# Altium footprint library Package_DFN_QFN.PcbLib: 557 footprints (part 32 of 35)
Each footprint in its own frame and in the unit in brackets; x right, y up, seen from the top. Pads: shape width x height; smd on the part's side, far side on the other; paste and mask are expansions set on the pad; w line width, h text height; cw(c..) or ccw(c..) is an arc to the next point about the centre after c.
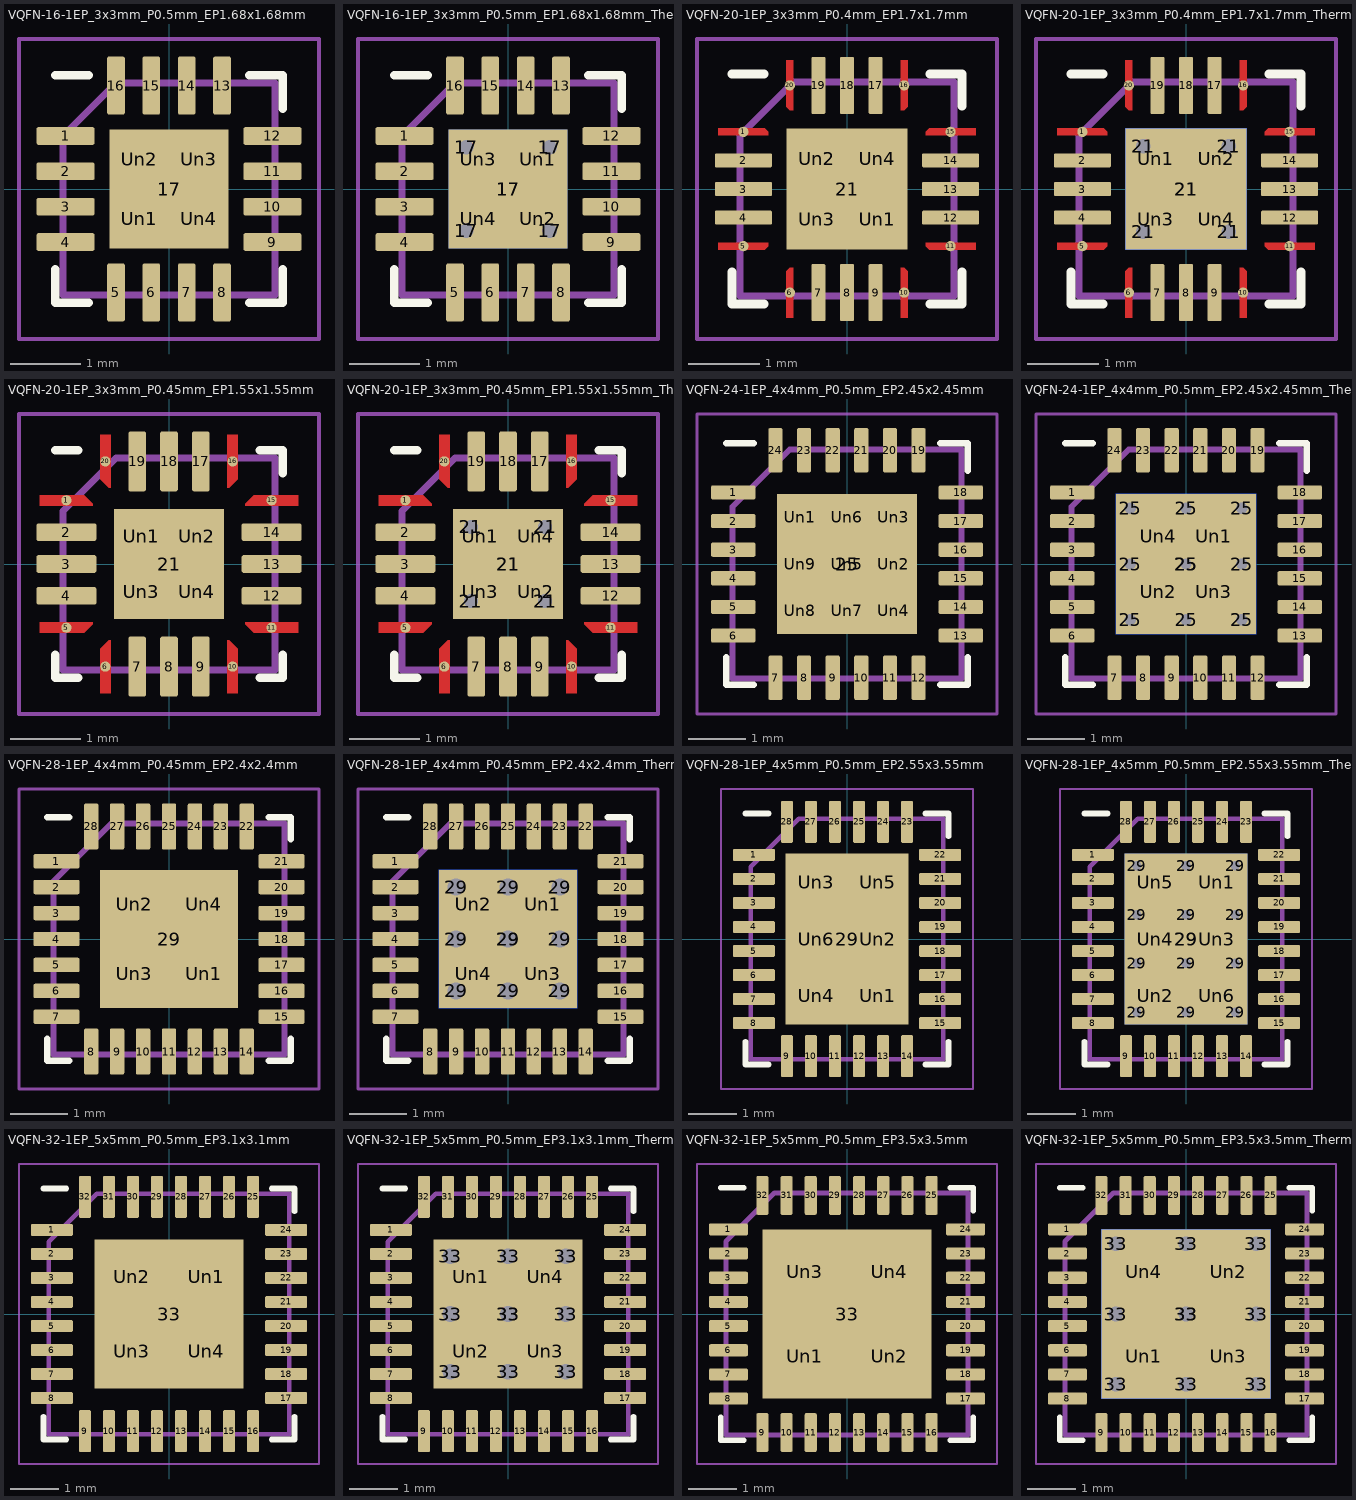
[diagram p31: the footprints below, top view; thin cyan lines are the x and y axes]

## VQFN-16-1EP_3x3mm_P0.5mm_EP1.68x1.68mm [mm]
pads (21):
  rrect25% 0.825x0.25 smd: 1(-1.462,0.75) 2(-1.462,0.25) 3(-1.462,-0.25) 4(-1.462,-0.75) 9(1.462,-0.75) 10(1.462,-0.25) 11(1.462,0.25) 12(1.462,0.75)
  rrect25% 0.25x0.825 smd: 5(-0.75,-1.462) 6(-0.25,-1.462) 7(0.25,-1.462) 8(0.75,-1.462) 13(0.75,1.462) 14(0.25,1.462) 15(-0.25,1.462) 16(-0.75,1.462)
  rect 1.68x1.68 smd: 17(0,0)
  rrect25% 0.68x0.68 on Top Paste: Un1(-0.42,-0.42) Un2(-0.42,0.42) Un3(0.42,0.42) Un4(0.42,-0.42)
F.SilkS:
  lines w0.12: -1.61,-1.135 -1.61,-1.61 -1.135,-1.61 ; -1.61,1.61 -1.135,1.61 ; 1.135,-1.61 1.61,-1.61 1.61,-1.135 ; 1.135,1.61 1.61,1.61 1.61,1.135
F.CrtYd:
  lines w0.05: -2.12,-2.12 2.12,-2.12 2.12,2.12 -2.12,2.12 -2.12,-2.12
F.Fab:
  lines w0.1: -1.5,-1.5 1.5,-1.5 1.5,1.5 -0.75,1.5 -1.5,0.75 -1.5,-1.5
  text "'.Designator'" at -3.033,-0.628 h0.75

## VQFN-16-1EP_3x3mm_P0.5mm_EP1.68x1.68mm_ThermalVias [mm]
pads (26):
  rrect25% 0.825x0.25 smd: 1(-1.462,0.75) 2(-1.462,0.25) 3(-1.462,-0.25) 4(-1.462,-0.75) 9(1.462,-0.75) 10(1.462,-0.25) 11(1.462,0.25) 12(1.462,0.75)
  rrect25% 0.25x0.825 smd: 5(-0.75,-1.462) 6(-0.25,-1.462) 7(0.25,-1.462) 8(0.75,-1.462) 13(0.75,1.462) 14(0.25,1.462) 15(-0.25,1.462) 16(-0.75,1.462)
  round 0.5 hole 0.2: 17(-0.59,-0.59) 17(-0.59,0.59) 17(0.59,-0.59) 17(0.59,0.59)
  rect 1.68x1.68 smd: 17(0,0)
  rect 1.68x1.68 smd far side: 17(0,0)
  rrect25% 0.73x0.73 on Top Paste: Un1(0.42,0.42) Un2(0.42,-0.42) Un3(-0.42,0.42) Un4(-0.42,-0.42)
F.SilkS:
  lines w0.12: -1.61,-1.135 -1.61,-1.61 -1.135,-1.61 ; -1.61,1.61 -1.135,1.61 ; 1.135,-1.61 1.61,-1.61 1.61,-1.135 ; 1.135,1.61 1.61,1.61 1.61,1.135
F.CrtYd:
  lines w0.05: -2.12,-2.12 -2.12,2.12 2.12,2.12 2.12,-2.12 -2.12,-2.12
F.Fab:
  lines w0.1: -1.5,-1.5 -1.5,0.75 -0.75,1.5 1.5,1.5 1.5,-1.5 -1.5,-1.5
  text "'.Designator'" at -3.033,-0.628 h0.75

## VQFN-20-1EP_3x3mm_P0.4mm_EP1.7x1.7mm [mm]
pads (25):
  round 0.143 smd: 1(-1.45,0.8) 5(-1.45,-0.8) 6(-0.8,-1.45) 10(0.8,-1.45) 11(1.45,-0.8) 15(1.45,0.8) 16(0.8,1.45) 20(-0.8,1.45)
  rrect25% 0.8x0.2 smd: 2(-1.45,0.4) 3(-1.45,0) 4(-1.45,-0.4) 12(1.45,-0.4) 13(1.45,0) 14(1.45,0.4)
  rrect25% 0.2x0.8 smd: 7(-0.4,-1.45) 8(0,-1.45) 9(0.4,-1.45) 17(0.4,1.45) 18(0,1.45) 19(-0.4,1.45)
  rect 1.7x1.7 smd: 21(0,0)
  rrect25% 0.69x0.69 on Top Paste: Un1(0.425,-0.425) Un2(-0.425,0.425) Un3(-0.425,-0.425) Un4(0.425,0.425)
F.Cu:
  region: -1.1,0.799 -1.1,0.75 -1.8,0.75 -1.8,0.85 -1.151,0.85
  region: -1.1,-0.799 -1.151,-0.85 -1.8,-0.85 -1.8,-0.75 -1.1,-0.75
  region: -0.75,-1.8 -0.85,-1.8 -0.85,-1.151 -0.799,-1.1 -0.75,-1.1
  region: 0.85,-1.151 0.85,-1.8 0.75,-1.8 0.75,-1.1 0.799,-1.1
  region: 1.8,-0.85 1.151,-0.85 1.1,-0.799 1.1,-0.75 1.8,-0.75
  region: 1.8,0.75 1.1,0.75 1.1,0.799 1.151,0.85 1.8,0.85
  region: 0.85,1.151 0.799,1.1 0.75,1.1 0.75,1.8 0.85,1.8
  region: -0.75,1.1 -0.799,1.1 -0.85,1.151 -0.85,1.8 -0.75,1.8
F.SilkS:
  lines w0.12: -1.61,-1.16 -1.61,-1.61 -1.16,-1.61 ; -1.61,1.61 -1.16,1.61 ; 1.16,-1.61 1.61,-1.61 1.61,-1.16 ; 1.16,1.61 1.61,1.61 1.61,1.16
F.Paste:
  region: -1.1,0.799 -1.1,0.75 -1.8,0.75 -1.8,0.85 -1.151,0.85
  region: -1.1,-0.799 -1.151,-0.85 -1.8,-0.85 -1.8,-0.75 -1.1,-0.75
  region: -0.75,-1.8 -0.85,-1.8 -0.85,-1.151 -0.799,-1.1 -0.75,-1.1
  region: 0.85,-1.151 0.85,-1.8 0.75,-1.8 0.75,-1.1 0.799,-1.1
  region: 1.8,-0.85 1.151,-0.85 1.1,-0.799 1.1,-0.75 1.8,-0.75
  region: 1.8,0.75 1.1,0.75 1.1,0.799 1.151,0.85 1.8,0.85
  region: 0.85,1.151 0.799,1.1 0.75,1.1 0.75,1.8 0.85,1.8
  region: -0.75,1.1 -0.799,1.1 -0.85,1.151 -0.85,1.8 -0.75,1.8
F.Mask:
  region: -1.1,0.799 -1.1,0.75 -1.8,0.75 -1.8,0.85 -1.151,0.85
  region: -1.1,-0.799 -1.151,-0.85 -1.8,-0.85 -1.8,-0.75 -1.1,-0.75
  region: -0.75,-1.8 -0.85,-1.8 -0.85,-1.151 -0.799,-1.1 -0.75,-1.1
  region: 0.85,-1.151 0.85,-1.8 0.75,-1.8 0.75,-1.1 0.799,-1.1
  region: 1.8,-0.85 1.151,-0.85 1.1,-0.799 1.1,-0.75 1.8,-0.75
  region: 1.8,0.75 1.1,0.75 1.1,0.799 1.151,0.85 1.8,0.85
  region: 0.85,1.151 0.799,1.1 0.75,1.1 0.75,1.8 0.85,1.8
  region: -0.75,1.1 -0.799,1.1 -0.85,1.151 -0.85,1.8 -0.75,1.8
F.CrtYd:
  lines w0.05: -2.1,-2.1 -2.1,2.1 2.1,2.1 2.1,-2.1 -2.1,-2.1
F.Fab:
  lines w0.1: -1.5,-1.5 -1.5,0.75 -0.75,1.5 1.5,1.5 1.5,-1.5 -1.5,-1.5
  text "'.Designator'" at -3.033,-0.628 h0.75

## VQFN-20-1EP_3x3mm_P0.4mm_EP1.7x1.7mm_ThermalVias [mm]
pads (30):
  round 0.143 smd: 1(-1.45,0.8) 5(-1.45,-0.8) 6(-0.8,-1.45) 10(0.8,-1.45) 11(1.45,-0.8) 15(1.45,0.8) 16(0.8,1.45) 20(-0.8,1.45)
  rrect25% 0.8x0.2 smd: 2(-1.45,0.4) 3(-1.45,0) 4(-1.45,-0.4) 12(1.45,-0.4) 13(1.45,0) 14(1.45,0.4)
  rrect25% 0.2x0.8 smd: 7(-0.4,-1.45) 8(0,-1.45) 9(0.4,-1.45) 17(0.4,1.45) 18(0,1.45) 19(-0.4,1.45)
  round 0.5 hole 0.2: 21(-0.6,-0.6) 21(-0.6,0.6) 21(0.6,-0.6) 21(0.6,0.6)
  rect 1.7x1.7 smd far side: 21(0,0)
  rect 1.7x1.7 smd: 21(0,0)
  rrect25% 0.74x0.74 on Top Paste: Un1(-0.425,0.425) Un2(0.425,0.425) Un3(-0.425,-0.425) Un4(0.425,-0.425)
F.Cu:
  region: -1.1,0.799 -1.1,0.75 -1.8,0.75 -1.8,0.85 -1.151,0.85
  region: -1.1,-0.799 -1.151,-0.85 -1.8,-0.85 -1.8,-0.75 -1.1,-0.75
  region: -0.75,-1.8 -0.85,-1.8 -0.85,-1.151 -0.799,-1.1 -0.75,-1.1
  region: 0.85,-1.151 0.85,-1.8 0.75,-1.8 0.75,-1.1 0.799,-1.1
  region: 1.8,-0.85 1.151,-0.85 1.1,-0.799 1.1,-0.75 1.8,-0.75
  region: 1.8,0.75 1.1,0.75 1.1,0.799 1.151,0.85 1.8,0.85
  region: 0.85,1.151 0.799,1.1 0.75,1.1 0.75,1.8 0.85,1.8
  region: -0.75,1.1 -0.799,1.1 -0.85,1.151 -0.85,1.8 -0.75,1.8
F.SilkS:
  lines w0.12: -1.61,-1.16 -1.61,-1.61 -1.16,-1.61 ; -1.61,1.61 -1.16,1.61 ; 1.16,-1.61 1.61,-1.61 1.61,-1.16 ; 1.16,1.61 1.61,1.61 1.61,1.16
F.Paste:
  region: -1.1,0.799 -1.1,0.75 -1.8,0.75 -1.8,0.85 -1.151,0.85
  region: -1.1,-0.799 -1.151,-0.85 -1.8,-0.85 -1.8,-0.75 -1.1,-0.75
  region: -0.75,-1.8 -0.85,-1.8 -0.85,-1.151 -0.799,-1.1 -0.75,-1.1
  region: 0.85,-1.151 0.85,-1.8 0.75,-1.8 0.75,-1.1 0.799,-1.1
  region: 1.8,-0.85 1.151,-0.85 1.1,-0.799 1.1,-0.75 1.8,-0.75
  region: 1.8,0.75 1.1,0.75 1.1,0.799 1.151,0.85 1.8,0.85
  region: 0.85,1.151 0.799,1.1 0.75,1.1 0.75,1.8 0.85,1.8
  region: -0.75,1.1 -0.799,1.1 -0.85,1.151 -0.85,1.8 -0.75,1.8
F.Mask:
  region: -1.1,0.799 -1.1,0.75 -1.8,0.75 -1.8,0.85 -1.151,0.85
  region: -1.1,-0.799 -1.151,-0.85 -1.8,-0.85 -1.8,-0.75 -1.1,-0.75
  region: -0.75,-1.8 -0.85,-1.8 -0.85,-1.151 -0.799,-1.1 -0.75,-1.1
  region: 0.85,-1.151 0.85,-1.8 0.75,-1.8 0.75,-1.1 0.799,-1.1
  region: 1.8,-0.85 1.151,-0.85 1.1,-0.799 1.1,-0.75 1.8,-0.75
  region: 1.8,0.75 1.1,0.75 1.1,0.799 1.151,0.85 1.8,0.85
  region: 0.85,1.151 0.799,1.1 0.75,1.1 0.75,1.8 0.85,1.8
  region: -0.75,1.1 -0.799,1.1 -0.85,1.151 -0.85,1.8 -0.75,1.8
F.CrtYd:
  lines w0.05: -2.1,-2.1 2.1,-2.1 2.1,2.1 -2.1,2.1 -2.1,-2.1
F.Fab:
  lines w0.1: -1.5,-1.5 1.5,-1.5 1.5,1.5 -0.75,1.5 -1.5,0.75 -1.5,-1.5
  text "'.Designator'" at -3.033,-0.628 h0.75

## VQFN-20-1EP_3x3mm_P0.45mm_EP1.55x1.55mm [mm]
pads (25):
  round 0.144 smd: 1(-1.45,0.9) 5(-1.45,-0.9) 6(-0.9,-1.45) 10(0.9,-1.45) 11(1.45,-0.9) 15(1.45,0.9) 16(0.9,1.45) 20(-0.9,1.45)
  rrect25% 0.85x0.25 smd: 2(-1.45,0.45) 3(-1.45,0) 4(-1.45,-0.45) 12(1.45,-0.45) 13(1.45,0) 14(1.45,0.45)
  rrect25% 0.25x0.85 smd: 7(-0.45,-1.45) 8(0,-1.45) 9(0.45,-1.45) 17(0.45,1.45) 18(0,1.45) 19(-0.45,1.45)
  rect 1.55x1.55 smd: 21(0,0)
  rrect25% 0.62x0.62 on Top Paste: Un1(-0.39,0.39) Un2(0.39,0.39) Un3(-0.39,-0.39) Un4(0.39,-0.39)
F.Cu:
  region: -1.075,0.854 -1.075,0.825 -1.825,0.825 -1.825,0.975 -1.196,0.975
  region: -1.075,-0.854 -1.196,-0.975 -1.825,-0.975 -1.825,-0.825 -1.075,-0.825
  region: -0.825,-1.825 -0.975,-1.825 -0.975,-1.196 -0.854,-1.075 -0.825,-1.075
  region: 0.975,-1.196 0.975,-1.825 0.825,-1.825 0.825,-1.075 0.854,-1.075
  region: 1.825,-0.975 1.196,-0.975 1.075,-0.854 1.075,-0.825 1.825,-0.825
  region: 1.825,0.825 1.075,0.825 1.075,0.854 1.196,0.975 1.825,0.975
  region: 0.975,1.196 0.854,1.075 0.825,1.075 0.825,1.825 0.975,1.825
  region: -0.825,1.075 -0.854,1.075 -0.975,1.196 -0.975,1.825 -0.825,1.825
F.SilkS:
  lines w0.12: -1.61,-1.285 -1.61,-1.61 -1.285,-1.61 ; -1.61,1.61 -1.285,1.61 ; 1.285,-1.61 1.61,-1.61 1.61,-1.285 ; 1.285,1.61 1.61,1.61 1.61,1.285
F.Paste:
  region: -1.075,0.854 -1.075,0.825 -1.825,0.825 -1.825,0.975 -1.196,0.975
  region: -1.075,-0.854 -1.196,-0.975 -1.825,-0.975 -1.825,-0.825 -1.075,-0.825
  region: -0.825,-1.825 -0.975,-1.825 -0.975,-1.196 -0.854,-1.075 -0.825,-1.075
  region: 0.975,-1.196 0.975,-1.825 0.825,-1.825 0.825,-1.075 0.854,-1.075
  region: 1.825,-0.975 1.196,-0.975 1.075,-0.854 1.075,-0.825 1.825,-0.825
  region: 1.825,0.825 1.075,0.825 1.075,0.854 1.196,0.975 1.825,0.975
  region: 0.975,1.196 0.854,1.075 0.825,1.075 0.825,1.825 0.975,1.825
  region: -0.825,1.075 -0.854,1.075 -0.975,1.196 -0.975,1.825 -0.825,1.825
F.Mask:
  region: -1.075,0.854 -1.075,0.825 -1.825,0.825 -1.825,0.975 -1.196,0.975
  region: -1.075,-0.854 -1.196,-0.975 -1.825,-0.975 -1.825,-0.825 -1.075,-0.825
  region: -0.825,-1.825 -0.975,-1.825 -0.975,-1.196 -0.854,-1.075 -0.825,-1.075
  region: 0.975,-1.196 0.975,-1.825 0.825,-1.825 0.825,-1.075 0.854,-1.075
  region: 1.825,-0.975 1.196,-0.975 1.075,-0.854 1.075,-0.825 1.825,-0.825
  region: 1.825,0.825 1.075,0.825 1.075,0.854 1.196,0.975 1.825,0.975
  region: 0.975,1.196 0.854,1.075 0.825,1.075 0.825,1.825 0.975,1.825
  region: -0.825,1.075 -0.854,1.075 -0.975,1.196 -0.975,1.825 -0.825,1.825
F.CrtYd:
  lines w0.05: -2.12,-2.12 -2.12,2.12 2.12,2.12 2.12,-2.12 -2.12,-2.12
F.Fab:
  lines w0.1: -1.5,-1.5 -1.5,0.75 -0.75,1.5 1.5,1.5 1.5,-1.5 -1.5,-1.5
  text "'.Designator'" at -3.033,-0.628 h0.75

## VQFN-20-1EP_3x3mm_P0.45mm_EP1.55x1.55mm_ThermalVias [mm]
pads (30):
  round 0.144 smd: 1(-1.45,0.9) 5(-1.45,-0.9) 6(-0.9,-1.45) 10(0.9,-1.45) 11(1.45,-0.9) 15(1.45,0.9) 16(0.9,1.45) 20(-0.9,1.45)
  rrect25% 0.85x0.25 smd: 2(-1.45,0.45) 3(-1.45,0) 4(-1.45,-0.45) 12(1.45,-0.45) 13(1.45,0) 14(1.45,0.45)
  rrect25% 0.25x0.85 smd: 7(-0.45,-1.45) 8(0,-1.45) 9(0.45,-1.45) 17(0.45,1.45) 18(0,1.45) 19(-0.45,1.45)
  round 0.5 hole 0.2: 21(-0.525,-0.525) 21(-0.525,0.525) 21(0.525,-0.525) 21(0.525,0.525)
  rect 1.55x1.55 smd far side: 21(0,0)
  rect 1.55x1.55 smd: 21(0,0)
  rrect25% 0.67x0.67 on Top Paste: Un1(-0.39,0.39) Un2(0.39,-0.39) Un3(-0.39,-0.39) Un4(0.39,0.39)
F.Cu:
  region: -1.075,0.854 -1.075,0.825 -1.825,0.825 -1.825,0.975 -1.196,0.975
  region: -1.075,-0.854 -1.196,-0.975 -1.825,-0.975 -1.825,-0.825 -1.075,-0.825
  region: -0.825,-1.825 -0.975,-1.825 -0.975,-1.196 -0.854,-1.075 -0.825,-1.075
  region: 0.975,-1.196 0.975,-1.825 0.825,-1.825 0.825,-1.075 0.854,-1.075
  region: 1.825,-0.975 1.196,-0.975 1.075,-0.854 1.075,-0.825 1.825,-0.825
  region: 1.825,0.825 1.075,0.825 1.075,0.854 1.196,0.975 1.825,0.975
  region: 0.975,1.196 0.854,1.075 0.825,1.075 0.825,1.825 0.975,1.825
  region: -0.825,1.075 -0.854,1.075 -0.975,1.196 -0.975,1.825 -0.825,1.825
F.SilkS:
  lines w0.12: -1.61,-1.285 -1.61,-1.61 -1.285,-1.61 ; -1.61,1.61 -1.285,1.61 ; 1.285,-1.61 1.61,-1.61 1.61,-1.285 ; 1.285,1.61 1.61,1.61 1.61,1.285
F.Paste:
  region: -1.075,0.854 -1.075,0.825 -1.825,0.825 -1.825,0.975 -1.196,0.975
  region: -1.075,-0.854 -1.196,-0.975 -1.825,-0.975 -1.825,-0.825 -1.075,-0.825
  region: -0.825,-1.825 -0.975,-1.825 -0.975,-1.196 -0.854,-1.075 -0.825,-1.075
  region: 0.975,-1.196 0.975,-1.825 0.825,-1.825 0.825,-1.075 0.854,-1.075
  region: 1.825,-0.975 1.196,-0.975 1.075,-0.854 1.075,-0.825 1.825,-0.825
  region: 1.825,0.825 1.075,0.825 1.075,0.854 1.196,0.975 1.825,0.975
  region: 0.975,1.196 0.854,1.075 0.825,1.075 0.825,1.825 0.975,1.825
  region: -0.825,1.075 -0.854,1.075 -0.975,1.196 -0.975,1.825 -0.825,1.825
F.Mask:
  region: -1.075,0.854 -1.075,0.825 -1.825,0.825 -1.825,0.975 -1.196,0.975
  region: -1.075,-0.854 -1.196,-0.975 -1.825,-0.975 -1.825,-0.825 -1.075,-0.825
  region: -0.825,-1.825 -0.975,-1.825 -0.975,-1.196 -0.854,-1.075 -0.825,-1.075
  region: 0.975,-1.196 0.975,-1.825 0.825,-1.825 0.825,-1.075 0.854,-1.075
  region: 1.825,-0.975 1.196,-0.975 1.075,-0.854 1.075,-0.825 1.825,-0.825
  region: 1.825,0.825 1.075,0.825 1.075,0.854 1.196,0.975 1.825,0.975
  region: 0.975,1.196 0.854,1.075 0.825,1.075 0.825,1.825 0.975,1.825
  region: -0.825,1.075 -0.854,1.075 -0.975,1.196 -0.975,1.825 -0.825,1.825
F.CrtYd:
  lines w0.05: -2.12,-2.12 -2.12,2.12 2.12,2.12 2.12,-2.12 -2.12,-2.12
F.Fab:
  lines w0.1: -1.5,-1.5 1.5,-1.5 1.5,1.5 -0.75,1.5 -1.5,0.75 -1.5,-1.5
  text "'.Designator'" at -3.033,-0.628 h0.75

## VQFN-24-1EP_4x4mm_P0.5mm_EP2.45x2.45mm [mm]
pads (34):
  rrect25% 0.775x0.25 smd: 1(-1.987,1.25) 2(-1.987,0.75) 3(-1.987,0.25) 4(-1.987,-0.25) 5(-1.987,-0.75) 6(-1.987,-1.25) 13(1.987,-1.25) 14(1.987,-0.75) 15(1.987,-0.25) 16(1.987,0.25) 17(1.987,0.75) 18(1.987,1.25)
  rrect25% 0.25x0.775 smd: 7(-1.25,-1.987) 8(-0.75,-1.987) 9(-0.25,-1.987) 10(0.25,-1.987) 11(0.75,-1.987) 12(1.25,-1.987) 19(1.25,1.987) 20(0.75,1.987) 21(0.25,1.987) 22(-0.25,1.987) 23(-0.75,1.987) 24(-1.25,1.987)
  rect 2.45x2.45 smd: 25(0,0)
  rrect25% 0.66x0.66 on Top Paste: Un1(-0.82,0.82) Un2(0.82,0) Un3(0.82,0.82) Un4(0.82,-0.82) Un5(0,0) Un6(0,0.82) Un7(0,-0.82) Un8(-0.82,-0.82) Un9(-0.82,0)
F.SilkS:
  lines w0.12: -2.11,-1.635 -2.11,-2.11 -1.635,-2.11 ; -2.11,2.11 -1.635,2.11 ; 1.635,-2.11 2.11,-2.11 2.11,-1.635 ; 1.635,2.11 2.11,2.11 2.11,1.635
F.CrtYd:
  lines w0.05: -2.62,-2.62 -2.62,2.62 2.62,2.62 2.62,-2.62 -2.62,-2.62
F.Fab:
  lines w0.1: -2,-2 -2,1 -1,2 2,2 2,-2 -2,-2
  text "'.Designator'" at -4.047,-0.84 h1

## VQFN-24-1EP_4x4mm_P0.5mm_EP2.45x2.45mm_ThermalVias [mm]
pads (39):
  rrect25% 0.775x0.25 smd: 1(-1.987,1.25) 2(-1.987,0.75) 3(-1.987,0.25) 4(-1.987,-0.25) 5(-1.987,-0.75) 6(-1.987,-1.25) 13(1.987,-1.25) 14(1.987,-0.75) 15(1.987,-0.25) 16(1.987,0.25) 17(1.987,0.75) 18(1.987,1.25)
  rrect25% 0.25x0.775 smd: 7(-1.25,-1.987) 8(-0.75,-1.987) 9(-0.25,-1.987) 10(0.25,-1.987) 11(0.75,-1.987) 12(1.25,-1.987) 19(1.25,1.987) 20(0.75,1.987) 21(0.25,1.987) 22(-0.25,1.987) 23(-0.75,1.987) 24(-1.25,1.987)
  round 0.5 hole 0.2: 25(-0.975,-0.975) 25(-0.975,0) 25(-0.975,0.975) 25(0,-0.975) 25(0,0) 25(0,0.975) 25(0.975,-0.975) 25(0.975,0) 25(0.975,0.975)
  rect 2.45x2.45 smd: 25(0,0)
  rect 2.45x2.45 smd far side: 25(0,0)
  round 0.756 on Top Paste: Un1(0.487,0.487) Un2(-0.487,-0.487) Un3(0.487,-0.487) Un4(-0.487,0.487)
F.SilkS:
  lines w0.12: -2.11,-1.635 -2.11,-2.11 -1.635,-2.11 ; -2.11,2.11 -1.635,2.11 ; 1.635,-2.11 2.11,-2.11 2.11,-1.635 ; 1.635,2.11 2.11,2.11 2.11,1.635
F.Paste:
  region: 0.789,0.662 0.789,0.313 0.662,0.186 0.313,0.186 0.186,0.313 0.186,0.662 0.313,0.789 0.662,0.789
  region: -0.186,-0.313 -0.186,-0.662 -0.313,-0.789 -0.662,-0.789 -0.789,-0.662 -0.789,-0.313 -0.662,-0.186 -0.313,-0.186
  region: 0.789,-0.313 0.789,-0.662 0.662,-0.789 0.313,-0.789 0.186,-0.662 0.186,-0.313 0.313,-0.186 0.662,-0.186
  region: -0.186,0.662 -0.186,0.313 -0.313,0.186 -0.662,0.186 -0.789,0.313 -0.789,0.662 -0.662,0.789 -0.313,0.789
F.CrtYd:
  lines w0.05: -2.62,-2.62 2.62,-2.62 2.62,2.62 -2.62,2.62 -2.62,-2.62
F.Fab:
  lines w0.1: -2,-2 2,-2 2,2 -1,2 -2,1 -2,-2
  text "'.Designator'" at -4.047,-0.84 h1

## VQFN-28-1EP_4x4mm_P0.45mm_EP2.4x2.4mm [mm]
pads (33):
  rrect25% 0.8x0.25 smd: 1(-1.95,1.35) 2(-1.95,0.9) 3(-1.95,0.45) 4(-1.95,0) 5(-1.95,-0.45) 6(-1.95,-0.9) 7(-1.95,-1.35) 15(1.95,-1.35) 16(1.95,-0.9) 17(1.95,-0.45) 18(1.95,0) 19(1.95,0.45) 20(1.95,0.9) 21(1.95,1.35)
  rrect25% 0.25x0.8 smd: 8(-1.35,-1.95) 9(-0.9,-1.95) 10(-0.45,-1.95) 11(0,-1.95) 12(0.45,-1.95) 13(0.9,-1.95) 14(1.35,-1.95) 22(1.35,1.95) 23(0.9,1.95) 24(0.45,1.95) 25(0,1.95) 26(-0.45,1.95) 27(-0.9,1.95) 28(-1.35,1.95)
  rect 2.4x2.4 smd: 29(0,0)
  rrect25% 0.97x0.97 on Top Paste: Un1(0.6,-0.6) Un2(-0.6,0.6) Un3(-0.6,-0.6) Un4(0.6,0.6)
F.SilkS:
  lines w0.12: -2.11,-1.735 -2.11,-2.11 -1.735,-2.11 ; -2.11,2.11 -1.735,2.11 ; 1.735,-2.11 2.11,-2.11 2.11,-1.735 ; 1.735,2.11 2.11,2.11 2.11,1.735
F.CrtYd:
  lines w0.05: -2.6,-2.6 2.6,-2.6 2.6,2.6 -2.6,2.6 -2.6,-2.6
F.Fab:
  lines w0.1: -2,-2 2,-2 2,2 -1,2 -2,1 -2,-2
  text "'.Designator'" at -4.047,-0.84 h1

## VQFN-28-1EP_4x4mm_P0.45mm_EP2.4x2.4mm_ThermalVias [mm]
pads (43):
  rrect25% 0.8x0.25 smd: 1(-1.95,1.35) 2(-1.95,0.9) 3(-1.95,0.45) 4(-1.95,0) 5(-1.95,-0.45) 6(-1.95,-0.9) 7(-1.95,-1.35) 15(1.95,-1.35) 16(1.95,-0.9) 17(1.95,-0.45) 18(1.95,0) 19(1.95,0.45) 20(1.95,0.9) 21(1.95,1.35)
  rrect25% 0.25x0.8 smd: 8(-1.35,-1.95) 9(-0.9,-1.95) 10(-0.45,-1.95) 11(0,-1.95) 12(0.45,-1.95) 13(0.9,-1.95) 14(1.35,-1.95) 22(1.35,1.95) 23(0.9,1.95) 24(0.45,1.95) 25(0,1.95) 26(-0.45,1.95) 27(-0.9,1.95) 28(-1.35,1.95)
  round 0.6 hole 0.3: 29(-0.9,-0.9) 29(-0.9,0) 29(-0.9,0.9) 29(0,-0.9) 29(0,0) 29(0,0.9) 29(0.9,-0.9) 29(0.9,0) 29(0.9,0.9)
  rect 2.4x2.4 smd: 29(0,0)
  rect 2.4x2.4 smd far side: 29(0,0)
  rrect25% 1x1 on Top Paste: Un1(0.6,0.6) Un2(-0.6,0.6) Un3(0.6,-0.6) Un4(-0.6,-0.6)
F.SilkS:
  lines w0.12: -2.11,-1.735 -2.11,-2.11 -1.735,-2.11 ; -2.11,2.11 -1.735,2.11 ; 1.735,-2.11 2.11,-2.11 2.11,-1.735 ; 1.735,2.11 2.11,2.11 2.11,1.735
F.CrtYd:
  lines w0.05: -2.6,-2.6 -2.6,2.6 2.6,2.6 2.6,-2.6 -2.6,-2.6
F.Fab:
  lines w0.1: -2,-2 -2,1 -1,2 2,2 2,-2 -2,-2
  text "'.Designator'" at -4.047,-0.84 h1

## VQFN-28-1EP_4x5mm_P0.5mm_EP2.55x3.55mm [mm]
pads (35):
  rrect25% 0.875x0.25 smd: 1(-1.937,1.75) 2(-1.937,1.25) 3(-1.937,0.75) 4(-1.937,0.25) 5(-1.937,-0.25) 6(-1.937,-0.75) 7(-1.937,-1.25) 8(-1.937,-1.75) 15(1.937,-1.75) 16(1.937,-1.25) 17(1.937,-0.75) 18(1.937,-0.25) 19(1.937,0.25) 20(1.937,0.75) 21(1.937,1.25) 22(1.937,1.75)
  rrect25% 0.25x0.875 smd: 9(-1.25,-2.438) 10(-0.75,-2.438) 11(-0.25,-2.438) 12(0.25,-2.438) 13(0.75,-2.438) 14(1.25,-2.438) 23(1.25,2.438) 24(0.75,2.438) 25(0.25,2.438) 26(-0.25,2.438) 27(-0.75,2.438) 28(-1.25,2.438)
  rect 2.55x3.55 smd: 29(0,0)
  rrect25% 1.03x0.95 on Top Paste: Un1(0.635,-1.18) Un2(0.635,0) Un3(-0.635,1.18) Un4(-0.635,-1.18) Un5(0.635,1.18) Un6(-0.635,0)
F.SilkS:
  lines w0.12: -2.11,-2.135 -2.11,-2.61 -1.635,-2.61 ; -2.11,2.61 -1.635,2.61 ; 1.635,-2.61 2.11,-2.61 2.11,-2.135 ; 1.635,2.61 2.11,2.61 2.11,2.135
F.CrtYd:
  lines w0.05: -2.62,-3.12 -2.62,3.12 2.62,3.12 2.62,-3.12 -2.62,-3.12
F.Fab:
  lines w0.1: -2,-2.5 2,-2.5 2,2.5 -1,2.5 -2,1.5 -2,-2.5
  text "'.Designator'" at -4.047,-0.84 h1

## VQFN-28-1EP_4x5mm_P0.5mm_EP2.55x3.55mm_ThermalVias [mm]
pads (48):
  rrect25% 0.875x0.25 smd: 1(-1.937,1.75) 2(-1.937,1.25) 3(-1.937,0.75) 4(-1.937,0.25) 5(-1.937,-0.25) 6(-1.937,-0.75) 7(-1.937,-1.25) 8(-1.937,-1.75) 15(1.937,-1.75) 16(1.937,-1.25) 17(1.937,-0.75) 18(1.937,-0.25) 19(1.937,0.25) 20(1.937,0.75) 21(1.937,1.25) 22(1.937,1.75)
  rrect25% 0.25x0.875 smd: 9(-1.25,-2.438) 10(-0.75,-2.438) 11(-0.25,-2.438) 12(0.25,-2.438) 13(0.75,-2.438) 14(1.25,-2.438) 23(1.25,2.438) 24(0.75,2.438) 25(0.25,2.438) 26(-0.25,2.438) 27(-0.75,2.438) 28(-1.25,2.438)
  round 0.5 hole 0.2: 29(-1.025,-1.525) 29(-1.025,-0.508) 29(-1.025,0.508) 29(-1.025,1.525) 29(0,-1.525) 29(0,-0.508) 29(0,0.508) 29(0,1.525) 29(1.025,-1.525) 29(1.025,-0.508) 29(1.025,0.508) 29(1.025,1.525)
  rect 2.55x3.55 smd far side: 29(0,0)
  rect 2.55x3.55 smd: 29(0,0)
  rrect25% 1.03x0.95 on Top Paste: Un1(0.635,1.18) Un2(-0.635,-1.18) Un3(0.635,0) Un4(-0.635,0) Un5(-0.635,1.18) Un6(0.635,-1.18)
F.SilkS:
  lines w0.12: -2.11,-2.135 -2.11,-2.61 -1.635,-2.61 ; -2.11,2.61 -1.635,2.61 ; 1.635,-2.61 2.11,-2.61 2.11,-2.135 ; 1.635,2.61 2.11,2.61 2.11,2.135
F.CrtYd:
  lines w0.05: -2.62,-3.12 2.62,-3.12 2.62,3.12 -2.62,3.12 -2.62,-3.12
F.Fab:
  lines w0.1: -2,-2.5 2,-2.5 2,2.5 -1,2.5 -2,1.5 -2,-2.5
  text "'.Designator'" at -4.047,-0.84 h1

## VQFN-32-1EP_5x5mm_P0.5mm_EP3.1x3.1mm [mm]
pads (37):
  rrect25% 0.875x0.25 smd: 1(-2.438,1.75) 2(-2.438,1.25) 3(-2.438,0.75) 4(-2.438,0.25) 5(-2.438,-0.25) 6(-2.438,-0.75) 7(-2.438,-1.25) 8(-2.438,-1.75) 17(2.438,-1.75) 18(2.438,-1.25) 19(2.438,-0.75) 20(2.438,-0.25) 21(2.438,0.25) 22(2.438,0.75) 23(2.438,1.25) 24(2.438,1.75)
  rrect25% 0.25x0.875 smd: 9(-1.75,-2.438) 10(-1.25,-2.438) 11(-0.75,-2.438) 12(-0.25,-2.438) 13(0.25,-2.438) 14(0.75,-2.438) 15(1.25,-2.438) 16(1.75,-2.438) 25(1.75,2.438) 26(1.25,2.438) 27(0.75,2.438) 28(0.25,2.438) 29(-0.25,2.438) 30(-0.75,2.438) 31(-1.25,2.438) 32(-1.75,2.438)
  rect 3.1x3.1 smd: 33(0,0)
  rrect20% 1.25x1.25 on Top Paste: Un1(0.775,0.775) Un2(-0.775,0.775) Un3(-0.775,-0.775) Un4(0.775,-0.775)
F.SilkS:
  lines w0.12: -2.61,-2.135 -2.61,-2.61 -2.135,-2.61 ; -2.61,2.61 -2.135,2.61 ; 2.135,-2.61 2.61,-2.61 2.61,-2.135 ; 2.135,2.61 2.61,2.61 2.61,2.135
F.CrtYd:
  lines w0.05: -3.12,-3.12 -3.12,3.12 3.12,3.12 3.12,-3.12 -3.12,-3.12
F.Fab:
  lines w0.1: -2.5,-2.5 2.5,-2.5 2.5,2.5 -1.5,2.5 -2.5,1.5 -2.5,-2.5
  text "'.Designator'" at -4.047,-0.84 h1

## VQFN-32-1EP_5x5mm_P0.5mm_EP3.1x3.1mm_ThermalVias [mm]
pads (47):
  rrect25% 0.875x0.25 smd: 1(-2.438,1.75) 2(-2.438,1.25) 3(-2.438,0.75) 4(-2.438,0.25) 5(-2.438,-0.25) 6(-2.438,-0.75) 7(-2.438,-1.25) 8(-2.438,-1.75) 17(2.438,-1.75) 18(2.438,-1.25) 19(2.438,-0.75) 20(2.438,-0.25) 21(2.438,0.25) 22(2.438,0.75) 23(2.438,1.25) 24(2.438,1.75)
  rrect25% 0.25x0.875 smd: 9(-1.75,-2.438) 10(-1.25,-2.438) 11(-0.75,-2.438) 12(-0.25,-2.438) 13(0.25,-2.438) 14(0.75,-2.438) 15(1.25,-2.438) 16(1.75,-2.438) 25(1.75,2.438) 26(1.25,2.438) 27(0.75,2.438) 28(0.25,2.438) 29(-0.25,2.438) 30(-0.75,2.438) 31(-1.25,2.438) 32(-1.75,2.438)
  round 0.63 hole 0.33: 33(-1.2,-1.2) 33(-1.2,0) 33(-1.2,1.2) 33(0,-1.2) 33(0,0) 33(0,1.2) 33(1.2,-1.2) 33(1.2,0) 33(1.2,1.2)
  rect 3.1x3.1 smd: 33(0,0)
  rect 3.03x3.03 smd far side: 33(0,0)
  rrect19% 1.3x1.3 on Top Paste: Un1(-0.775,0.775) Un2(-0.775,-0.775) Un3(0.775,-0.775) Un4(0.775,0.775)
F.SilkS:
  lines w0.12: -2.61,-2.135 -2.61,-2.61 -2.135,-2.61 ; -2.61,2.61 -2.135,2.61 ; 2.135,-2.61 2.61,-2.61 2.61,-2.135 ; 2.135,2.61 2.61,2.61 2.61,2.135
F.CrtYd:
  lines w0.05: -3.12,-3.12 -3.12,3.12 3.12,3.12 3.12,-3.12 -3.12,-3.12
F.Fab:
  lines w0.1: -2.5,-2.5 2.5,-2.5 2.5,2.5 -1.5,2.5 -2.5,1.5 -2.5,-2.5
  text "'.Designator'" at -4.047,-0.84 h1

## VQFN-32-1EP_5x5mm_P0.5mm_EP3.5x3.5mm [mm]
pads (37):
  rrect25% 0.8x0.25 smd: 1(-2.45,1.75) 2(-2.45,1.25) 3(-2.45,0.75) 4(-2.45,0.25) 5(-2.45,-0.25) 6(-2.45,-0.75) 7(-2.45,-1.25) 8(-2.45,-1.75) 17(2.45,-1.75) 18(2.45,-1.25) 19(2.45,-0.75) 20(2.45,-0.25) 21(2.45,0.25) 22(2.45,0.75) 23(2.45,1.25) 24(2.45,1.75)
  rrect25% 0.25x0.8 smd: 9(-1.75,-2.45) 10(-1.25,-2.45) 11(-0.75,-2.45) 12(-0.25,-2.45) 13(0.25,-2.45) 14(0.75,-2.45) 15(1.25,-2.45) 16(1.75,-2.45) 25(1.75,2.45) 26(1.25,2.45) 27(0.75,2.45) 28(0.25,2.45) 29(-0.25,2.45) 30(-0.75,2.45) 31(-1.25,2.45) 32(-1.75,2.45)
  rect 3.5x3.5 smd: 33(0,0)
  rrect18% 1.41x1.41 on Top Paste: Un1(-0.875,-0.875) Un2(0.875,-0.875) Un3(-0.875,0.875) Un4(0.875,0.875)
F.SilkS:
  lines w0.12: -2.61,-2.135 -2.61,-2.61 -2.135,-2.61 ; -2.61,2.61 -2.135,2.61 ; 2.135,-2.61 2.61,-2.61 2.61,-2.135 ; 2.135,2.61 2.61,2.61 2.61,2.135
F.CrtYd:
  lines w0.05: -3.1,-3.1 3.1,-3.1 3.1,3.1 -3.1,3.1 -3.1,-3.1
F.Fab:
  lines w0.1: -2.5,-2.5 2.5,-2.5 2.5,2.5 -1.5,2.5 -2.5,1.5 -2.5,-2.5
  text "'.Designator'" at -4.047,-0.84 h1

## VQFN-32-1EP_5x5mm_P0.5mm_EP3.5x3.5mm_ThermalVias [mm]
pads (47):
  rrect25% 0.8x0.25 smd: 1(-2.45,1.75) 2(-2.45,1.25) 3(-2.45,0.75) 4(-2.45,0.25) 5(-2.45,-0.25) 6(-2.45,-0.75) 7(-2.45,-1.25) 8(-2.45,-1.75) 17(2.45,-1.75) 18(2.45,-1.25) 19(2.45,-0.75) 20(2.45,-0.25) 21(2.45,0.25) 22(2.45,0.75) 23(2.45,1.25) 24(2.45,1.75)
  rrect25% 0.25x0.8 smd: 9(-1.75,-2.45) 10(-1.25,-2.45) 11(-0.75,-2.45) 12(-0.25,-2.45) 13(0.25,-2.45) 14(0.75,-2.45) 15(1.25,-2.45) 16(1.75,-2.45) 25(1.75,2.45) 26(1.25,2.45) 27(0.75,2.45) 28(0.25,2.45) 29(-0.25,2.45) 30(-0.75,2.45) 31(-1.25,2.45) 32(-1.75,2.45)
  round 0.6 hole 0.3: 33(-1.45,-1.45) 33(-1.45,0) 33(-1.45,1.45) 33(0,-1.45) 33(0,0) 33(0,1.45) 33(1.45,-1.45) 33(1.45,0) 33(1.45,1.45)
  rect 3.5x3.5 smd: 33(0,0)
  rect 3.5x3.5 smd far side: 33(0,0)
  rrect17% 1.46x1.46 on Top Paste: Un1(-0.875,-0.875) Un2(0.875,0.875) Un3(0.875,-0.875) Un4(-0.875,0.875)
F.SilkS:
  lines w0.12: -2.61,-2.135 -2.61,-2.61 -2.135,-2.61 ; -2.61,2.61 -2.135,2.61 ; 2.135,-2.61 2.61,-2.61 2.61,-2.135 ; 2.135,2.61 2.61,2.61 2.61,2.135
F.CrtYd:
  lines w0.05: -3.1,-3.1 -3.1,3.1 3.1,3.1 3.1,-3.1 -3.1,-3.1
F.Fab:
  lines w0.1: -2.5,-2.5 -2.5,1.5 -1.5,2.5 2.5,2.5 2.5,-2.5 -2.5,-2.5
  text "'.Designator'" at -4.047,-0.84 h1